# Altium footprint library pw.PcbLib: 210 footprints (part 7 of 14)
Each footprint in its own frame and in the unit in brackets; x right, y up, seen from the top. Pads: shape width x height; smd on the part's side, far side on the other; paste and mask are expansions set on the pad; w line width, h text height; cw(c..) or ccw(c..) is an arc to the next point about the centre after c.
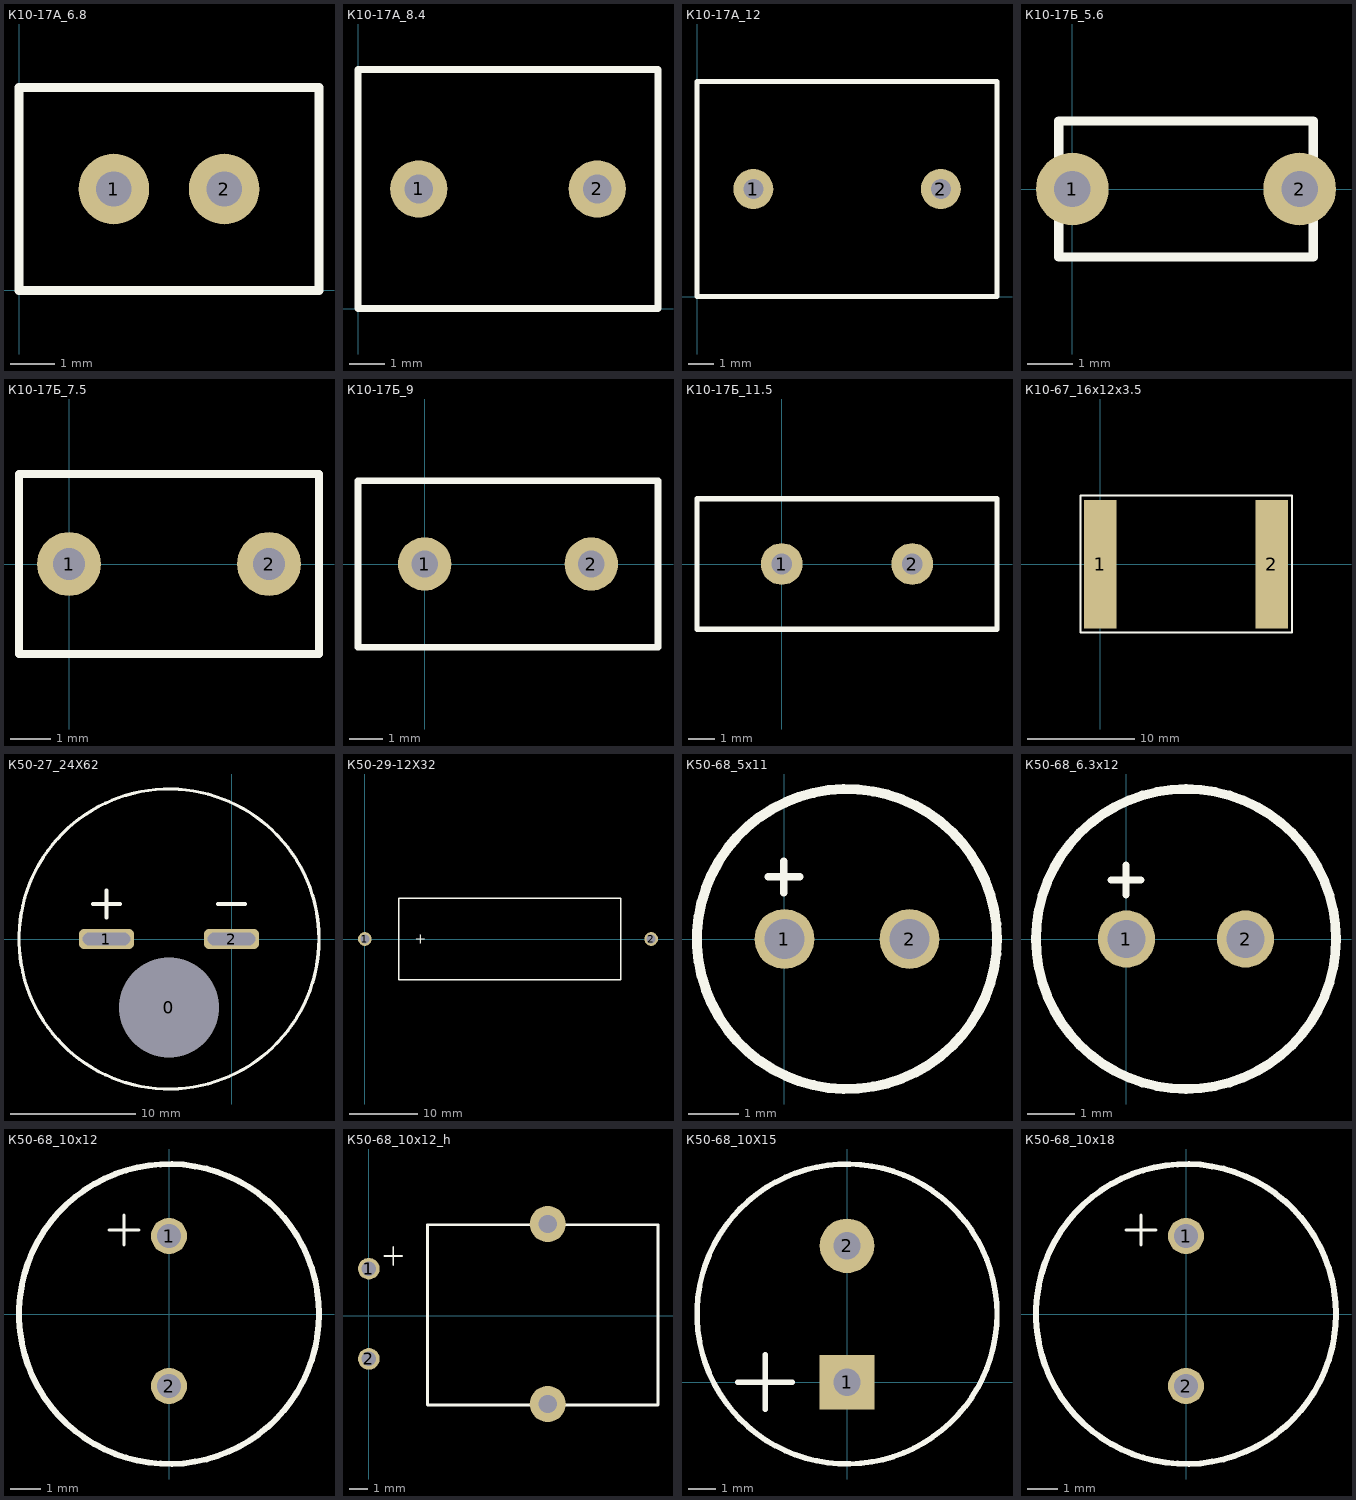
[diagram p6: the footprints below, top view; thin cyan lines are the x and y axes]

## К10-17А_6.8 [mm]
height 6.6
pads (2):
  round 1.6 hole 0.8: 1(2.15,2.3) 2(4.65,2.3)
Top Overlay:
  lines w0.2: 0,0 6.8,0 6.8,4.6 0,4.6 0,0
3D body: height 5.6, standoff 1, extent 0,0 6.8,4.6
3D body: height 1, standoff 0, extent 2.9,0 3.9,4.6
3D body: height 3, standoff -2, extent 4.353,2.001 4.95,2.6
3D body: height 3, standoff -2, extent 1.853,2.001 2.45,2.6

## К10-17А_8.4 [mm]
height 6.6
pads (2):
  round 1.6 hole 0.8: 1(1.7,3.35) 2(6.7,3.35)
Top Overlay:
  lines w0.2: 0,0 8.4,0 8.4,6.7 0,6.7 0,0
3D body: height 5.6, standoff 1, extent 0,0 8.4,6.7
3D body: height 1, standoff 0, extent 3.7,0 4.7,6.7
3D body: height 3, standoff -2, extent 6.403,3.051 7,3.65
3D body: height 3, standoff -2, extent 1.403,3.051 2,3.65

## К10-17А_12 [mm]
height 6.6
pads (2):
  round 1.6 hole 0.8: 1(2.25,4.3) 2(9.75,4.3)
Top Overlay:
  lines w0.2: 0,0 0,8.6 12,8.6 12,0 0,0
3D body: height 5.6, standoff 1, extent 0,0 11.975,8.6
3D body: height 1, standoff 0, extent 5.5,0 6.5,8.6
3D body: height 3, standoff -2, extent 9.453,4.001 10.05,4.6
3D body: height 3, standoff -2, extent 1.953,4.001 2.55,4.6

## К10-17Б_5.6 [mm]
height 4
pads (2):
  round 1.6 hole 0.8: 1(0,0) 2(5,0)
Top Overlay:
  lines w0.2: -0.3,-1.5 -0.3,1.5 5.3,1.5 5.3,-1.5 -0.3,-1.5
3D body: height 3, standoff -2, extent 4.703,-0.299 5.3,0.3
3D body: height 3, standoff -2, extent -0.297,-0.299 0.3,0.3
3D body: height 4, standoff 2, extent -0.3,-1.5 5.3,1.5

## К10-17Б_7.5 [mm]
height 5
pads (2):
  round 1.6 hole 0.8: 1(0,0) 2(5,0)
Top Overlay:
  lines w0.2: -1.25,-2.25 6.25,-2.25 6.25,2.25 -1.25,2.25 -1.25,-2.25
3D body: height 5, standoff 2, extent -1.25,-2.25 6.25,2.25
3D body: height 3, standoff -2, extent -0.297,-0.299 0.3,0.3
3D body: height 3, standoff -2, extent 4.703,-0.299 5.3,0.3

## К10-17Б_9 [mm]
height 7.1
pads (2):
  round 1.6 hole 0.8: 1(0,0) 2(5,0)
Top Overlay:
  lines w0.2: -2,-2.5 7,-2.5 7,2.5 -2,2.5 -2,-2.5
3D body: height 3, standoff -2, extent 4.703,-0.299 5.3,0.3
3D body: height 3, standoff -2, extent -0.297,-0.299 0.3,0.3
3D body: height 7.1, standoff 2, extent -2,-2.5 7,2.5

## К10-17Б_11.5 [mm]
height 9
pads (2):
  round 1.6 hole 0.8: 1(0,0) 2(5,0)
Top Overlay:
  lines w0.2: -3.25,-2.5 8.25,-2.5 8.25,2.5 -3.25,2.5 -3.25,-2.5
3D body: height 9, standoff 2, extent -3.25,-2.5 8.25,2.5
3D body: height 8, standoff -2, extent -0.297,-0.299 0.3,0.3
3D body: height 8, standoff -2, extent 4.703,-0.299 5.3,0.3

## К10-67_16x12x3.5 [mm]
pads (2):
  rect 3x12 smd: 1(0,0) 2(16,0)
Top Overlay:
  lines w0.2: -1.835,-6.388 -1.835,6.422 -1.584,6.422 17.897,6.422 17.897,-6.388 -1.835,-6.388
3D body: height 3.55, standoff 0, extent 14.5,-5.998 16,6
3D body: height 3.55, standoff 0, extent 0,-5.998 1.5,5.999
3D body: height 3.5, standoff 0, extent 0.251,-5.945 15.713,5.999

## К50-27_24Х62 [mm]
pads (3):
  round 1.8 hole 8 unplated: 0(-5,-5.5)
  rrect50% 4.4x1.6 hole 1 slot 3.8 at 0 deg unplated: 1(-10,0) 2(0,0)
Top Overlay:
  circle w0.254: c-5,0 r12
  lines w0.3: -11.1,2.8 -8.9,2.8 ; -10,1.7 -10,3.9 ; -1.1,2.8 1.1,2.8

## К50-29-12Х32 [mm]
pads (2):
  round 2 hole 1.3: 1(0,0) 2(42,0)
Top Overlay:
  lines w0.2: 5,-6 37.5,-6 37.5,6 5,6 5,0 5,-6
  text "+" at 7.3,-0.7 h1.52

## К50-68_5x11 [mm]
pads (2):
  round 1.2 hole 0.8 unplated: 1(0,0) 2(2.5,0)
Top Overlay:
  circle w0.2: c1.25,0 r3
  lines w0.15: -0.326,1.241 0.301,1.241 ; -0.012,0.928 -0.012,1.555
3D body "User Library-CAPAER_D063_L115_P025_W005X030.STEP": height 11.51, standoff -3, extent -1.914,-3.136 4.396,3.164

## К50-68_6.3x12 [mm]
pads (2):
  round 1.2 hole 0.8 unplated: 1(0,0) 2(2.5,0)
Top Overlay:
  circle w0.2: c1.25,0 r3.15
  lines w0.15: -0.326,1.241 0.301,1.241 ; -0.012,0.928 -0.012,1.555
3D body "User Library-Cap electro 6_3x12_5x2_5mm.step": height 13.03, standoff -3.01, extent -1.943,-3.13 4.408,3.221

## К50-68_10x12 [mm]
height 11
pads (2):
  round 1.2 hole 0.8: 1(0,2.6) 2(0,-2.4)
Top Overlay:
  circle w0.2: c0,0 r5
  lines w0.1: -2,2.8 -1,2.8 ; -1.5,2.3 -1.5,3.3
3D body "User Library-Cap-EL(10x12-5)T.step": height 12.5, standoff -3.5, extent -4.973,-4.992 5.013,5.01

## К50-68_10x12_h [mm]
height 11
pads (4):
  round 1.2 hole 0.8: 1(0,2.6) 2(0,-2.4)
  round 2 hole 1 unplated: ""(9.92,-4.9) ""(9.92,5.08)
Top Overlay:
  lines w0.1: 0.85,3.3 1.85,3.3 ; 1.35,2.8 1.35,3.8
  lines w0.15: 3.25,-4.96 3.25,5.042 16.031,5.042 16.031,-4.96 3.25,-4.96
3D body "User Library-Cap-EL(10x12-5)T.step": height 10, standoff 0, extent 0.029,-4.96 16.031,5.042

## К50-68_10X15 [mm]
height 30
pads (2):
  rect 2x2 hole 1 unplated: 1(0,0)
  round 2 hole 1 unplated: 2(0,5)
Top Overlay:
  circle w0.2: c0,2.5 r5.5
  lines w0.2: -4,0 -2,0 ; -3,-1 -3,1
3D body "К50-68_10x15.stp": height 15, standoff -3, extent -5,-2.5 5,7.5

## К50-68_10x18 [mm]
height 11
pads (2):
  round 1.2 hole 0.8: 1(0,2.6) 2(0,-2.4)
Top Overlay:
  circle w0.2: c0,0 r5
  lines w0.1: -2,2.8 -1,2.8 ; -1.5,2.3 -1.5,3.3
3D body "User Library-CAPAER_D100_L180_P050_W006X030.STEP": height 18.01, standoff -3, extent -5,-5 5,5.01